# Altium footprint library Altium_Lib.PcbLib: 334 footprints (part 18 of 21)
Each footprint in its own frame and in the unit in brackets; x right, y up, seen from the top. Pads: shape width x height; smd on the part's side, far side on the other; paste and mask are expansions set on the pad; w line width, h text height; cw(c..) or ccw(c..) is an arc to the next point about the centre after c.
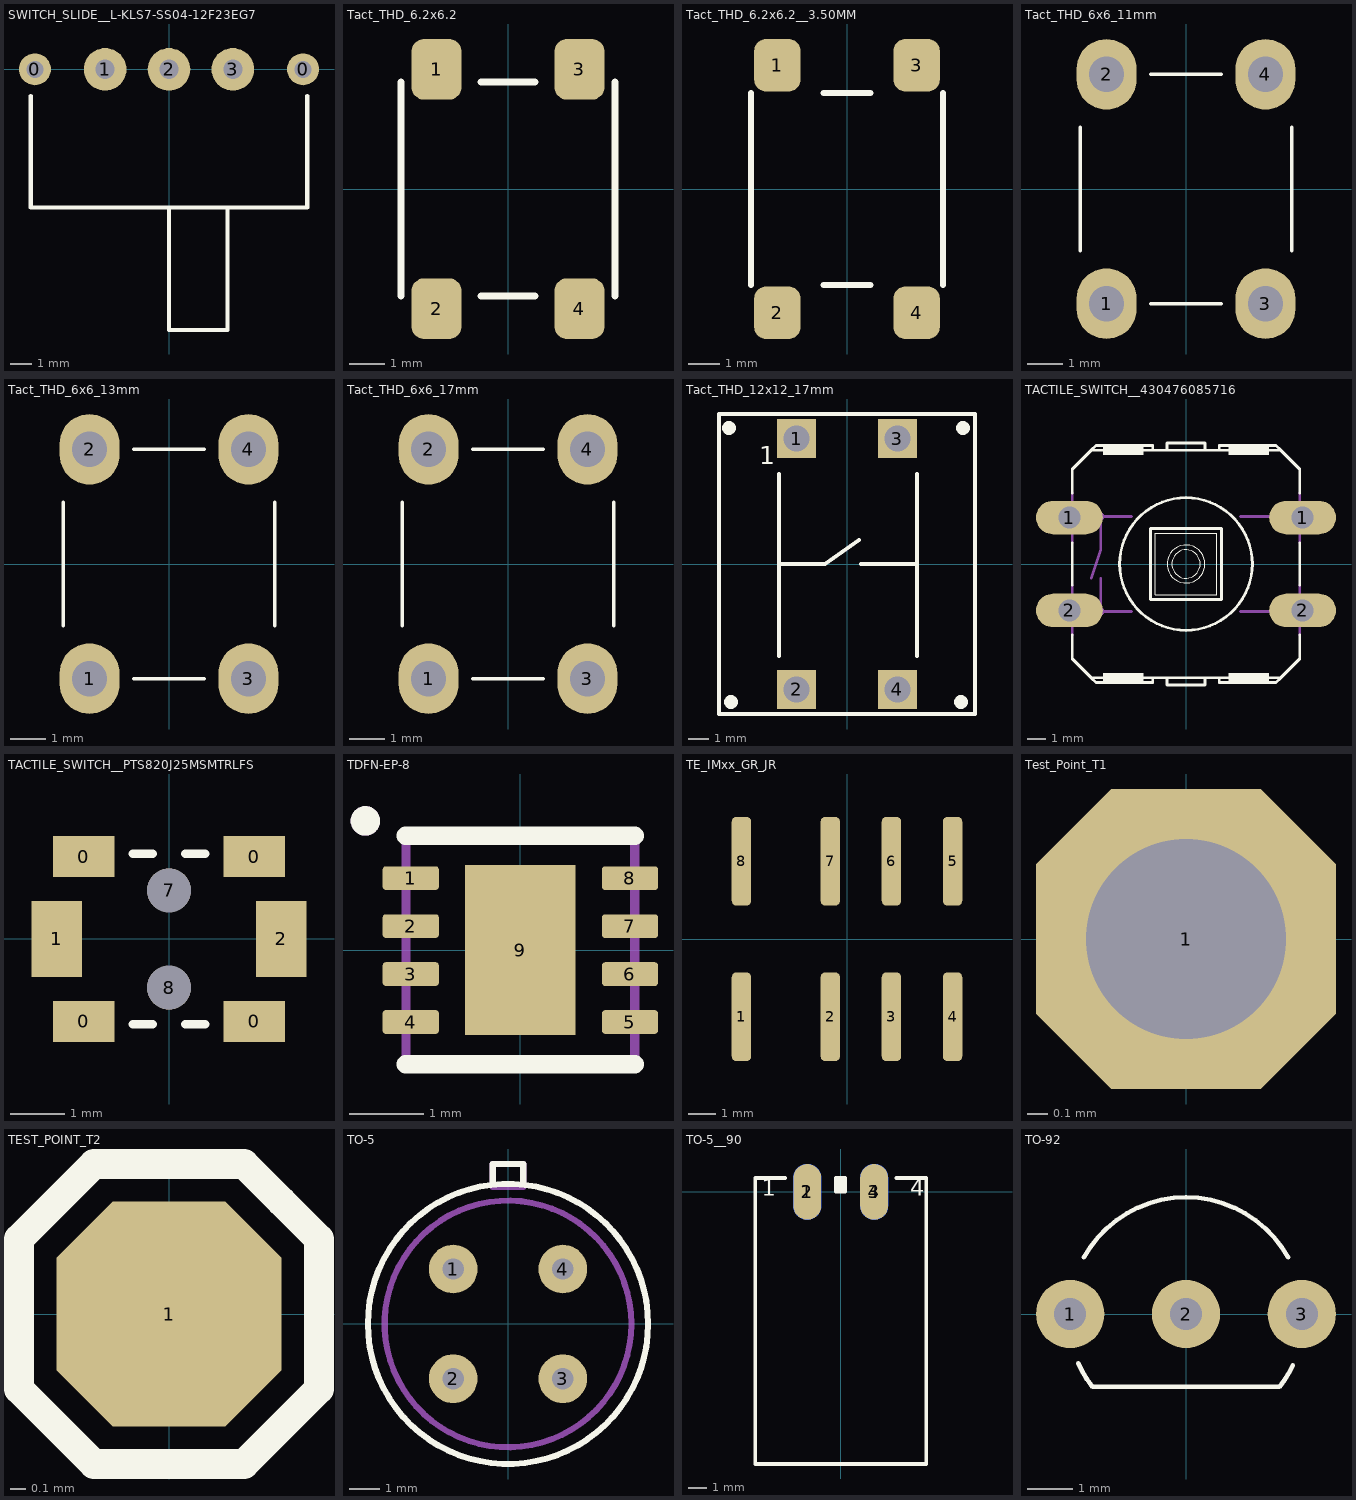
[diagram p17: the footprints below, top view; thin cyan lines are the x and y axes]

## SWITCH_SLIDE__L-KLS7-SS04-12F23EG7 [mm]
pads (5):
  round 1.5 hole 0.8: 0(-6.3,0) 0(6.3,0)
  round 2 hole 0.9: 1(-3,0) 2(0,0) 3(3,0)
Top Overlay:
  lines w0.2: -6.5,-1.25 -6.5,-6.5 6.5,-6.5 6.5,-1.25 ; 0,-6.5 0,-12.25 2.75,-12.25 2.75,-6.5
3D body "User Library-SLIDE SWITCH SS12F23.STEP": height 6.05, standoff -3.05, extent -6.5,-12.2 6.5,0.7

## Tact_THD_6.2x6.2 [mm]
pads (4):
  rrect50% 1.4x1.7 smd: 1(-2,3.35) 2(-2,-3.35) 3(2,3.35) 4(2,-3.35)
Top Overlay:
  lines w0.2: -3,-3 -3,3 ; -0.75,-3 0.75,-3 ; -0.75,3 0.75,3 ; 3,-3 3,3
3D body "430483025816 (rev1).stp": height 2.6, standoff 0.1, extent -3.11,-3.592 3.09,3.608

## Tact_THD_6.2x6.2__3.50MM [mm]
pads (4):
  rrect50% 1.5x1.7 smd: 1(-2.25,4) 2(-2.25,-4) 3(2.25,4) 4(2.25,-4)
Top Overlay:
  lines w0.2: -3.1,-3.1 -3.1,3.1 ; -0.75,-3.1 0.75,-3.1 ; -0.75,3.1 0.75,3.1 ; 3.1,-3.1 3.1,3.1
3D body "430481035816 (rev1).stp": height 3.6, standoff 0.1, extent -3.1,-4 3.1,4

## Tact_THD_6x6_11mm [mm]
height 17
pads (4):
  oval 1.7x2 hole 1: 1(-2.25,-3.25) 2(-2.25,3.25) 3(2.25,-3.25) 4(2.25,3.25)
Top Overlay:
  lines w0.1: -3,-1.75 -3,1.75 ; -1,-3.25 1,-3.25 ; -1,3.25 1,3.25 ; 3,-1.75 3,1.75
3D body "TACT_THD_6X6_11MM.STEP": height 11.1, standoff -3.4, extent -3,-3.85 3,3.85

## Tact_THD_6x6_13mm [mm]
height 17
pads (4):
  oval 1.7x2 hole 1: 1(-2.25,-3.25) 2(-2.25,3.25) 3(2.25,-3.25) 4(2.25,3.25)
Top Overlay:
  lines w0.1: -3,-1.75 -3,1.75 ; -1,-3.25 1,-3.25 ; -1,3.25 1,3.25 ; 3,-1.75 3,1.75
3D body "TL1105DFxxxx.STEP": height 13.11, standoff -3.44, extent -2.95,-4.097 3.05,3.797

## Tact_THD_6x6_17mm [mm]
height 17
pads (4):
  oval 1.7x2 hole 1: 1(-2.25,-3.25) 2(-2.25,3.25) 3(2.25,-3.25) 4(2.25,3.25)
Top Overlay:
  lines w0.1: -3,-1.75 -3,1.75 ; -1,-3.25 1,-3.25 ; -1,3.25 1,3.25 ; 3,-1.75 3,1.75
3D body "SKHHDH.STEP": height 17, standoff -3.5, extent -3.1,-3.95 3.1,3.95

## Tact_THD_12x12_17mm [mm]
pads (4):
  rect 1.95x1.95 hole 1.3: 1(-2.525,6.275) 2(-2.525,-6.275) 3(2.525,6.275) 4(2.525,-6.275)
Top Overlay:
  circle w0.406: c-5.9,6.8 r0.141
  circle w0.406: c5.8,6.8 r0.141
  circle w0.406: c5.7,-6.9 r0.141
  circle w0.406: c-5.8,-6.9 r0.141
  lines w0.2: -3.4,-4.6 -3.4,0 ; -3.4,4.5 -3.4,0 ; 0.6,1.2 -1.1,0 -3.4,0 ; 0.7,0 3.5,0 ; 3.5,-4.6 3.5,0 ; 3.5,4.5 3.5,0 ; -6.4,-7.5 6.4,-7.5 6.4,7.5 -6.4,7.5 -6.4,-7.5
  text "1" at -4.4,4.7 h1.57
3D body: height 17, standoff 0, extent -3.35,-3.35 3.35,3.35
3D body "User Library-tact switch 12x12x8mm.STEP": height 8.5, standoff -3.5, extent -6,-6.87 6,7

## TACTILE_SWITCH__430476085716 [mil]
pads (4):
  oval 141x70.5 hole 47: 1(-246,98) 1(246,98) 2(-246,-98) 2(246,-98)
Top Overlay:
  circle w6: c0,0 r140
  circle w2: c0,0 r40
  circle w2: c0,0 r30
  rectangle: 90,230 175,250
  rectangle: -175,230 -90,250
  rectangle: 90,-250 175,-230
  rectangle: -175,-250 -90,-230
  lines w2: -65,-65 65,-65 65,65 -65,65 -65,-65
  lines w6: -240,-150 -240,-200 -200,-240 ; -240,-45 -240,45 ; -240,150 -240,200 -200,240 ; 240,-150 240,-200 200,-240 ; 240,-45 240,45 ; 240,150 240,200 200,240 ; -200,-240 -70,-240 ; -200,-240 -190,-250 -70,-250 -70,-240 ; -200,240 -70,240 ; -200,240 -190,250 -70,250 -70,240 ; -70,-240 -40,-240 ; -70,240 -40,240 ; -40,-240 -40,-255 40,-255 40,-240 ; -40,-240 40,-240 ; -40,240 -40,255 40,255 40,240 ; -40,240 40,240 ; 40,-240 70,-240 ; 40,240 70,240 ; 70,-240 70,-250 190,-250 200,-240 ; 70,-240 200,-240 ; 70,240 200,240 ; 70,240 70,250 190,250 200,240 ; -75,-75 75,-75 75,75 -75,75 -75,-75
Mechanical 16:
  circle w6: c-180,100 r5
  circle w6: c-180,-100 r5
  rectangle: 240,-115 260,-80
  rectangle: 240,80 260,115
  rectangle: -260,80 -240,115
  rectangle: -260,-115 -240,-80
  lines w6: -240,-150 -240,-45 ; -240,45 -240,150 ; -200,-100 -180,-100 ; -200,-30 -180,30 -180,100 ; -200,100 -180,100 ; -180,-30 -180,-100 ; -115,-100 -180,-100 ; -115,100 -180,100 ; 115,-100 200,-100 ; 115,100 200,100 ; 240,-150 240,-45 ; 240,45 240,150
3D body "STEP-430476085716-rev1.stp": height 338.58, standoff -133.66, extent -275.02,-236.21 275.03,236.23

## TACTILE_SWITCH__PTS820J25MSMTRLFS [mil]
pads (8):
  rect 45x30 smd: 0(-62.01,-60.04) 0(-62.01,60.04) 0(62.01,60.04) 0(62.01,-60.04)
  rect 37x55 smd: 1(-81.69,0) 2(81.69,0)
  round 32 hole 32 mask-1000: 7(0,35.43) 8(0,-35.43)
Top Overlay:
  lines w6: -26.41,-62 -11.87,-62 ; -26.41,62 -11.87,62 ; 11.87,-62 26.41,-62 ; 11.87,62 26.41,62
Top Solder:
  region: 0,51.75 -6.24,50.5 -11.54,46.97 -15.07,41.68 -16.31,35.43 -15.07,29.19 -11.54,23.9 -6.24,20.36 0,19.12 6.24,20.36 11.54,23.9 15.07,29.19 16.31,35.43 15.07,41.68 11.54,46.97 6.24,50.5
  region: 0,-19.12 -6.24,-20.36 -11.54,-23.89 -15.07,-29.19 -16.31,-35.43 -15.07,-41.67 -11.54,-46.97 -6.24,-50.5 0,-51.74 6.24,-50.5 11.54,-46.97 15.07,-41.67 16.31,-35.43 15.07,-29.19 11.54,-23.89 6.24,-20.36
Bottom Solder:
  region: 0,51.75 -6.24,50.5 -11.54,46.97 -15.07,41.68 -16.31,35.43 -15.07,29.19 -11.54,23.9 -6.24,20.36 0,19.12 6.24,20.36 11.54,23.9 15.07,29.19 16.31,35.43 15.07,41.68 11.54,46.97 6.24,50.5
  region: 0,-19.12 -6.24,-20.36 -11.54,-23.89 -15.07,-29.19 -16.31,-35.43 -15.07,-41.67 -11.54,-46.97 -6.24,-50.5 0,-51.74 6.24,-50.5 11.54,-46.97 15.07,-41.67 16.31,-35.43 15.07,-29.19 11.54,-23.89 6.24,-20.36
3D body "PTS820J25MSMTRLFS.stp": height 80.71, standoff 1.77, extent -87.6,-57.09 89.57,57.09

## TDFN-EP-8 [mm]
pads (9):
  rrect25% 0.76x0.32 smd: 1(-1.485,0.975) 2(-1.485,0.325) 3(-1.485,-0.325) 4(-1.485,-0.975) 5(1.485,-0.975) 6(1.485,-0.325) 7(1.485,0.325) 8(1.485,0.975)
  rect 1.5x2.3 smd paste-2: 9(0,0)
Top Overlay:
  circle w0.2: c-2.1,1.75 r0.1
  lines w0.25: -1.55,-1.55 1.55,-1.55 ; -1.55,1.55 1.55,1.55
Top Paste:
  region: 0.47,-0.73 -0.47,-0.73 -0.47,0.73 0.47,0.73
Mechanical 13:
  circle w0.2: c-2.1,1.75 r0.1
  lines w0.127: -1.55,-1.55 -1.55,1.55 1.55,1.55 1.55,-1.55 -1.55,-1.55
3D body "step_temp.STEP": height 0.8, standoff 0, extent -1.5,-1.5 1.5,1.5

## TE_IMxx_GR_JR [mm]
height 5.359
pads (8):
  rrect50% 0.7x3.2 smd: 1(-3.8,-2.8) 2(-0.6,-2.8) 3(1.6,-2.8) 4(3.8,-2.8) 5(3.8,2.8) 6(1.6,2.8) 7(-0.6,2.8) 8(-3.8,2.8)
3D body "c-1462037-2-a-3d.stp": height 5.65, standoff 0, extent -5,-3.758 5,3.758

## Test_Point_T1 [mm]
pads (1):
  oct 1.5x1.5 hole 1: 1(0,0)

## TEST_POINT_T2 [mm]
pads (1):
  oct 1.5x1.5 smd mask+0.05: 1(0,0)
Top Overlay:
  lines w0.2: -1,-0.5 -0.5,-1 0.5,-1 1,-0.5 1,-0.25 1,0.5 0.75,0.75 0.5,1 -0.5,1 -1,0.5 -1,-0.5

## TO-5 [mm]
height 7.8
pads (4):
  round 1.6 hole 0.7: 1(-1.8,1.8) 2(-1.8,-1.8) 3(1.8,-1.8) 4(1.8,1.8)
Top Overlay:
  circle w0.2: c0,0 r4.6
  lines w0.2: -0.5,4.6 -0.5,5.25 0.5,5.25 0.5,4.6
Mechanical 15:
  circle w0.2: c0,0 r4.05
  circle w0.2: c1.8,-1.8 r0.25
  circle w0.2: c-1.8,-1.8 r0.25
  circle w0.2: c1.8,1.8 r0.25
  circle w0.2: c-1.8,1.8 r0.25
  lines w0.2: 0.25,5.25 0.5,5.25 ; 0.5,5.25 0.5,4.5 -0.5,4.5 -0.5,5.25 0.5,5.25
3D body "TGS2610-D00 3MM.STEP": height 12.4, standoff -3, extent -4.6,-4.625 4.6,4.575

## TO-5__90 [mm]
height 7.8
pads (4):
  oval 1.5x3 smd: 1(-1.8,0) 4(1.8,0)
  oval 1.5x3 smd far side: 2(-1.8,0) 3(1.8,0)
Top Overlay:
  lines w0.2: -3,0.75 -4.6,0.75 -4.6,-14.65 4.6,-14.65 4.6,0.75 3,0.75 ; -0.225,0.675 0.125,0.675 0.125,0.05 ; -0.1,0.05 -0.1,0.575 -0.1,0.625 ; 0.025,0.1 0.025,0.675 ; 0.225,0 -0.25,0 -0.25,0.75 0.25,0.75 0.25,0
  text "1" at -4.25,-0.5 h1.52
  text "4" at 3.75,-0.5 h1.52
3D body "TGS2610-D00 3MM.STEP": height 4.6, standoff -4.6, extent -4.6,-14.65 4.6,0.75

## TO-92 [mm]
pads (3):
  round 1.5 hole 0.7: 1(-2.54,0) 2(0,0) 3(2.54,0)
Top Overlay:
  lines w0.1: -2.364,-1.083 ccw(c0,0) -2.05,-1.6 2.05,-1.6 ccw(c0,0) 2.346,-1.122 ; -2.239,1.244 cw(c0,0) 2.239,1.244
3D body "User Library-TO-92_Bent.STEP": height 10, standoff -3, extent -2.79,-1.59 2.79,2.613